# Altium footprint library Vowstar_Basic_Device.PcbLib: 170 footprints (part 8 of 11)
Each footprint in its own frame and in the unit in brackets; x right, y up, seen from the top. Pads: shape width x height; smd on the part's side, far side on the other; paste and mask are expansions set on the pad; w line width, h text height; cw(c..) or ccw(c..) is an arc to the next point about the centre after c.
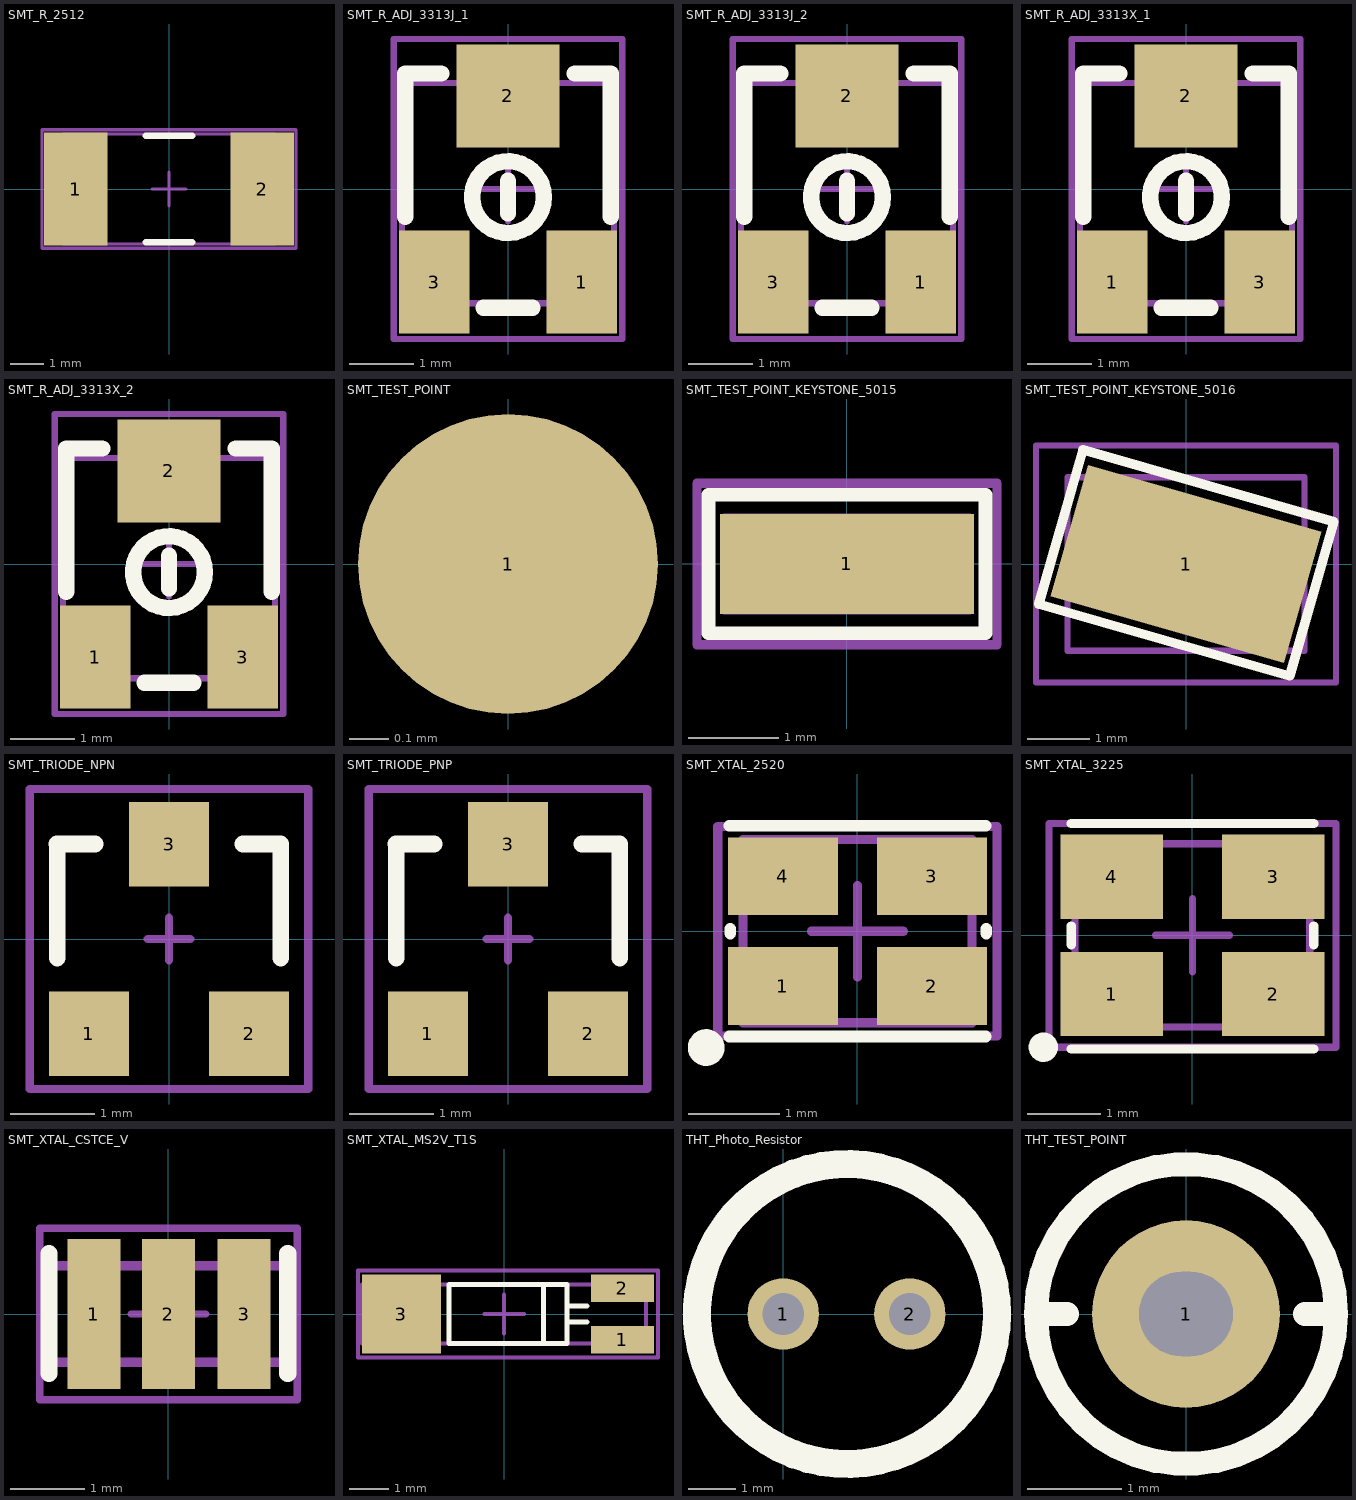
[diagram p7: the footprints below, top view; thin cyan lines are the x and y axes]

## SMT_R_2512 [mm] "Surface mount resistor 2512"
height 1.7
pads (2):
  rect 1.9x3.4 smd: 1(-2.8,0) 2(2.8,0)
Top Overlay:
  lines w0.2: -0.7,-1.6 0.7,-1.6 ; -0.7,1.6 0.7,1.6
Mechanical 13:
  lines w0.1: -3.175,-1.651 3.175,-1.651 3.175,1.651 -3.175,1.651 -3.175,-1.651
Mechanical 15:
  lines w0.1: -0.5,0 0.5,0 ; 0,-0.5 0,0.5 ; -3.81,-1.778 3.81,-1.778 3.81,1.778 -3.81,1.778 -3.81,-1.778
3D body "User Library-2512(6432M) Res.step": height 0.6, standoff 0, extent -3.2,-1.6 3.2,1.6

## SMT_R_ADJ_3313J_1 [mm] "3313J SMD Cermet Trimmer Adjustable resistor"
height 2.2
pads (3):
  rect 1.1x1.6 smd: 1(1.15,-1.45) 3(-1.15,-1.45)
  rect 1.6x1.6 smd: 2(0,1.45)
Top Overlay:
  circle w0.254: c0,-0.127 r0.559
  lines w0.254: -1.6,-0.432 -1.6,1.801 -1.039,1.801 ; -0.381,-1.849 0.381,-1.849 ; 0,-0.381 0,0.127 ; 1.039,1.801 1.6,1.801 1.6,-0.432
Mechanical 13:
  lines w0.1: -1.651,-1.778 1.651,-1.778 1.651,1.651 -1.651,1.651 -1.651,-1.778
Mechanical 15:
  lines w0.1: -0.5,0 0.5,0 ; 0,-0.5 0,0.5 ; -1.778,-2.337 1.778,-2.337 1.778,2.337 -1.778,2.337 -1.778,-2.337
3D body "User Library-3313J-1 SMD Cermet Trimmer.STEP": height 2.2, standoff 0, extent -1.6,-1.75 1.6,1.75

## SMT_R_ADJ_3313J_2 [mm] "3313J SMD Cermet Trimmer Adjustable resistor"
height 2.2
pads (3):
  rect 1.1x1.6 smd: 1(1.15,-1.45) 3(-1.15,-1.45)
  rect 1.6x1.6 smd: 2(0,1.45)
Top Overlay:
  circle w0.254: c0,-0.127 r0.559
  lines w0.254: -1.6,-0.432 -1.6,1.801 -1.039,1.801 ; -0.381,-1.849 0.381,-1.849 ; 0,-0.381 0,0.127 ; 1.039,1.801 1.6,1.801 1.6,-0.432
Mechanical 13:
  lines w0.1: -1.651,-1.778 1.651,-1.778 1.651,1.651 -1.651,1.651 -1.651,-1.778
Mechanical 15:
  lines w0.1: -0.5,0 0.5,0 ; 0,-0.5 0,0.5 ; -1.778,-2.337 1.778,-2.337 1.778,2.337 -1.778,2.337 -1.778,-2.337
3D body "User Library-3313J-2 SMD Cermet Trimmer.STEP": height 2.2, standoff 0, extent -1.6,-1.75 1.6,1.75

## SMT_R_ADJ_3313X_1 [mm] "3313J SMD Cermet Trimmer Adjustable resistor"
height 2.2
pads (3):
  rect 1.1x1.6 smd: 1(-1.15,-1.45) 3(1.15,-1.45)
  rect 1.6x1.6 smd: 2(0,1.45)
Top Overlay:
  circle w0.254: c0,-0.127 r0.559
  lines w0.254: -1.6,-0.432 -1.6,1.801 -1.039,1.801 ; -0.381,-1.849 0.381,-1.849 ; 0,-0.381 0,0.127 ; 1.039,1.801 1.6,1.801 1.6,-0.432
Mechanical 13:
  lines w0.1: -1.651,-1.778 -1.651,1.651 1.651,1.651 1.651,-1.778 -1.651,-1.778
Mechanical 15:
  lines w0.1: -0.5,0 0.5,0 ; 0,-0.5 0,0.5 ; -1.778,-2.337 -1.778,2.337 1.778,2.337 1.778,-2.337 -1.778,-2.337
3D body "User Library-3313J-1 SMD Cermet Trimmer.STEP": height 2.2, standoff 0, extent -1.6,-1.75 1.6,1.75

## SMT_R_ADJ_3313X_2 [mm] "3313J SMD Cermet Trimmer Adjustable resistor"
height 2.2
pads (3):
  rect 1.1x1.6 smd: 1(-1.15,-1.45) 3(1.15,-1.45)
  rect 1.6x1.6 smd: 2(0,1.45)
Top Overlay:
  circle w0.254: c0,-0.127 r0.559
  lines w0.254: -1.6,-0.432 -1.6,1.801 -1.039,1.801 ; -0.381,-1.849 0.381,-1.849 ; 0,-0.381 0,0.127 ; 1.039,1.801 1.6,1.801 1.6,-0.432
Mechanical 13:
  lines w0.1: -1.651,-1.778 -1.651,1.651 1.651,1.651 1.651,-1.778 -1.651,-1.778
Mechanical 15:
  lines w0.1: -0.5,0 0.5,0 ; 0,-0.5 0,0.5 ; -1.778,-2.337 -1.778,2.337 1.778,2.337 1.778,-2.337 -1.778,-2.337
3D body "User Library-3313J-2 SMD Cermet Trimmer.STEP": height 2.2, standoff 0, extent -1.6,-1.75 1.6,1.75

## SMT_TEST_POINT [mil] "SMT Test Point"
pads (1):
  round 30 smd: 1(0,0)

## SMT_TEST_POINT_KEYSTONE_5015 [mm] "KEYSTONE (SMT) SURFACE MOUNT TEST POINTS  3.4x1.8x1.5mm"
height 1.5
pads (1):
  rect 2.8x1.1 smd: 1(0,0)
Top Overlay:
  lines w0.152: -1.524,-0.762 1.524,-0.762 1.524,0.762 -1.524,0.762 -1.524,-0.762
Mechanical 13:
  lines w0.1: -1.346,-0.508 -1.346,0.508 1.346,0.508 1.346,-0.508 -1.346,-0.508
Mechanical 15:
  lines w0.1: -0.127,0 0.127,0 ; 0,-0.127 0,0.127 ; -1.651,-0.889 1.651,-0.889 1.651,0.889 -1.651,0.889 -1.651,-0.889
3D body "User Library-keystone_5015.step": height 1.52, standoff 0, extent -1.333,-0.508 1.333,0.508

## SMT_TEST_POINT_KEYSTONE_5016 [mm] "KEYSTONE (SMT) SURFACE MOUNT TEST POINTS  4.7x3.43x2.29mm"
height 2.29
pads (1):
  rect 3.9x2.2 smd rot 164: 1(0,0)
Top Overlay:
  lines w0.152: -2.369,-0.644 -1.658,1.838 2.38,0.68 1.668,-1.802 -2.369,-0.644
Mechanical 13:
  lines w0.1: -1.905,-1.397 1.905,-1.397 1.905,1.397 -1.905,1.397 -1.905,-1.397
Mechanical 15:
  lines w0.1: -0.127,0 0.127,0 ; 0,-0.127 0,0.127 ; -2.413,-1.905 -2.413,1.905 2.413,1.905 2.413,-1.905 -2.413,-1.905
3D body "User Library-keystone-5016.step": height 2.3, standoff 0, extent -1.905,-1.397 1.895,1.403

## SMT_TRIODE_NPN [mm] "Surface mount NPN transistor, package SOT-23"
height 1.1
pads (3):
  rect 0.95x1 smd: 1(-0.95,-1.125) 2(0.95,-1.125) 3(0,1.125)
Top Overlay:
  lines w0.2: -1.328,1.125 -0.875,1.125 ; -1.325,-0.225 -1.325,1.125 ; 0.875,1.125 1.325,1.125 1.325,-0.225
Mechanical 15:
  lines w0.1: -0.254,0 0.254,0 ; 0,-0.254 0,0.254 ; -1.651,-1.778 1.651,-1.778 1.651,1.778 -1.651,1.778 -1.651,-1.778
3D body "User Library-SOT23-3.step": height 1.3, standoff 0, extent -1.448,-1.397 1.452,1.403

## SMT_TRIODE_PNP [mm] "Surface mount PNP transistor, package SOT-23"
height 1.1
pads (3):
  rect 0.95x1 smd: 1(-0.95,-1.125) 2(0.95,-1.125) 3(0,1.125)
Top Overlay:
  lines w0.2: -1.328,1.125 -0.875,1.125 ; -1.325,-0.225 -1.325,1.125 ; 0.875,1.125 1.325,1.125 1.325,-0.225
Mechanical 15:
  lines w0.1: -0.254,0 0.254,0 ; 0,-0.254 0,0.254 ; -1.651,-1.778 -1.651,1.778 1.651,1.778 1.651,-1.778 -1.651,-1.778
3D body "User Library-SOT23-3.step": height 1.3, standoff 0, extent -1.448,-1.397 1.452,1.403

## SMT_XTAL_2520 [mm] "Quartz Crystal, SM; Body 2.5 x 2.0 mm"
height 1
pads (4):
  rect 1.2x0.85 smd: 1(-0.813,-0.6) 2(0.813,-0.6) 3(0.813,0.6) 4(-0.813,0.6)
Top Overlay:
  circle w0.2: c-1.651,-1.27 r0.1
  lines w0.127: -1.4,-1.15 1.4,-1.15 ; -1.4,1.15 1.4,1.15 ; -1.387,-0.025 -1.387,0.025 ; 1.407,-0.025 1.407,0.025
Mechanical 13:
  lines w0.1: -1.25,-1 -1.25,1 1.25,1 1.25,-1 -1.25,-1
Mechanical 15:
  lines w0.1: -0.5,0 0.5,0 ; 0,-0.5 0,0.5 ; -1.524,-1.143 1.524,-1.143 1.524,1.143 -1.524,1.143 -1.524,-1.143
3D body "User Library-Crystal-SMT-2520.STEP": height 0.79, standoff 0, extent -1.25,-1 1.25,1

## SMT_XTAL_3225 [mm] "Quartz Crystal, SM; Body 3.2 x 2.5 mm"
height 1
pads (4):
  rect 1.4x1.15 smd: 1(-1.1,-0.8) 2(1.1,-0.8) 3(1.1,0.8) 4(-1.1,0.8)
Top Overlay:
  circle w0.2: c-2.032,-1.524 r0.1
  lines w0.127: -1.651,-1.549 1.651,-1.549 ; -1.651,-0.127 -1.651,0.127 ; -1.651,1.524 1.651,1.524 ; 1.651,-0.127 1.651,0.127
Mechanical 13:
  lines w0.1: -1.6,-1.25 1.6,-1.25 1.6,1.25 -1.6,1.25 -1.6,-1.25
Mechanical 15:
  lines w0.1: -0.5,0 0.5,0 ; 0,-0.5 0,0.5 ; -1.956,-1.524 -1.956,1.524 1.956,1.524 1.956,-1.524 -1.956,-1.524
3D body "User Library-XTAL-SMT-3225.step": height 0.81, standoff 0, extent -1.6,-1.27 1.6,1.23

## SMT_XTAL_CSTCE_V [mil] "MURATA CSTCE_V"
pads (3):
  rect 28x79 smd: 1(-39.37,0) 2(0,0) 3(40,0)
Top Overlay:
  lines w9: -62.99,-31.5 -62.99,32 ; 63,-31.5 63,32
Mechanical 13:
  lines w5: -62.99,-25.59 -62.99,25.59 62.99,25.59 62.99,-25.59 -62.99,-25.59
Mechanical 15:
  lines w3.94: -19.69,0 19.68,0 ; 0,-19.68 0,19.69 ; -67.91,-45.28 67.91,-45.28 67.91,45.28 -67.91,45.28 -67.91,-45.28
3D body "User Library-Crystal-CSTCE_V-1.STEP": height 40.26, standoff -3.69, extent -62.99,-25.59 62.99,25.59

## SMT_XTAL_MS2V_T1S [mm] "MS2V-T1S is a miniature square-bodied 1.5 x 1.5 x 5 mm metal-can  package with formed leads"
height 1.58
pads (3):
  rect 1.6x0.7 smd: 1(3,-0.65) 2(3,0.65)
  rect 2x2 smd: 3(-2.6,0)
Top Overlay:
  lines w0.127: 1,-0.75 1,0.75 ; 1.6,-0.2 2.1,-0.2 ; 1.6,0.2 2.1,0.2 ; -1.4,-0.75 -1.4,0.75 1.6,0.75 1.6,-0.75 -1.4,-0.75
Mechanical 13:
  lines w0.1: -3.6,-0.75 -3.6,0.75 3.6,0.75 3.6,-0.75 -3.6,-0.75
Mechanical 15:
  lines w0.1: -0.5,0 0.5,0 ; 0,-0.5 0,0.5 ; -3.7,-1.1 3.9,-1.1 3.9,1.1 -3.7,1.1 -3.7,-1.1
3D body "MS2V-T1S.STEP": height 1.5, standoff 0, extent -3.6,-0.75 3.6,0.75

## THT_Photo_Resistor [mil] "PDV-P5001"
height 118.11
pads (2):
  round 60 hole 35: 1(0,0) 2(106.3,0)
Top Overlay:
  circle w23.62: c53.54,0 r125.99

## THT_TEST_POINT [mm] "THT Test Point"
pads (1):
  round 2 hole 0.9 slot 1 at 0 deg: 1(0,0)
Top Overlay:
  circle w0.254: c0,0 r1.6
  lines w0.254: -1.524,0 -1.27,0 ; 1.27,0 1.524,0